# Altium footprint library texas.PCBLIB: 168 footprints (part 12 of 14)
Each footprint in its own frame and in the unit in brackets; x right, y up, seen from the top. Pads: shape width x height; smd on the part's side, far side on the other; paste and mask are expansions set on the pad; w line width, h text height; cw(c..) or ccw(c..) is an arc to the next point about the centre after c.
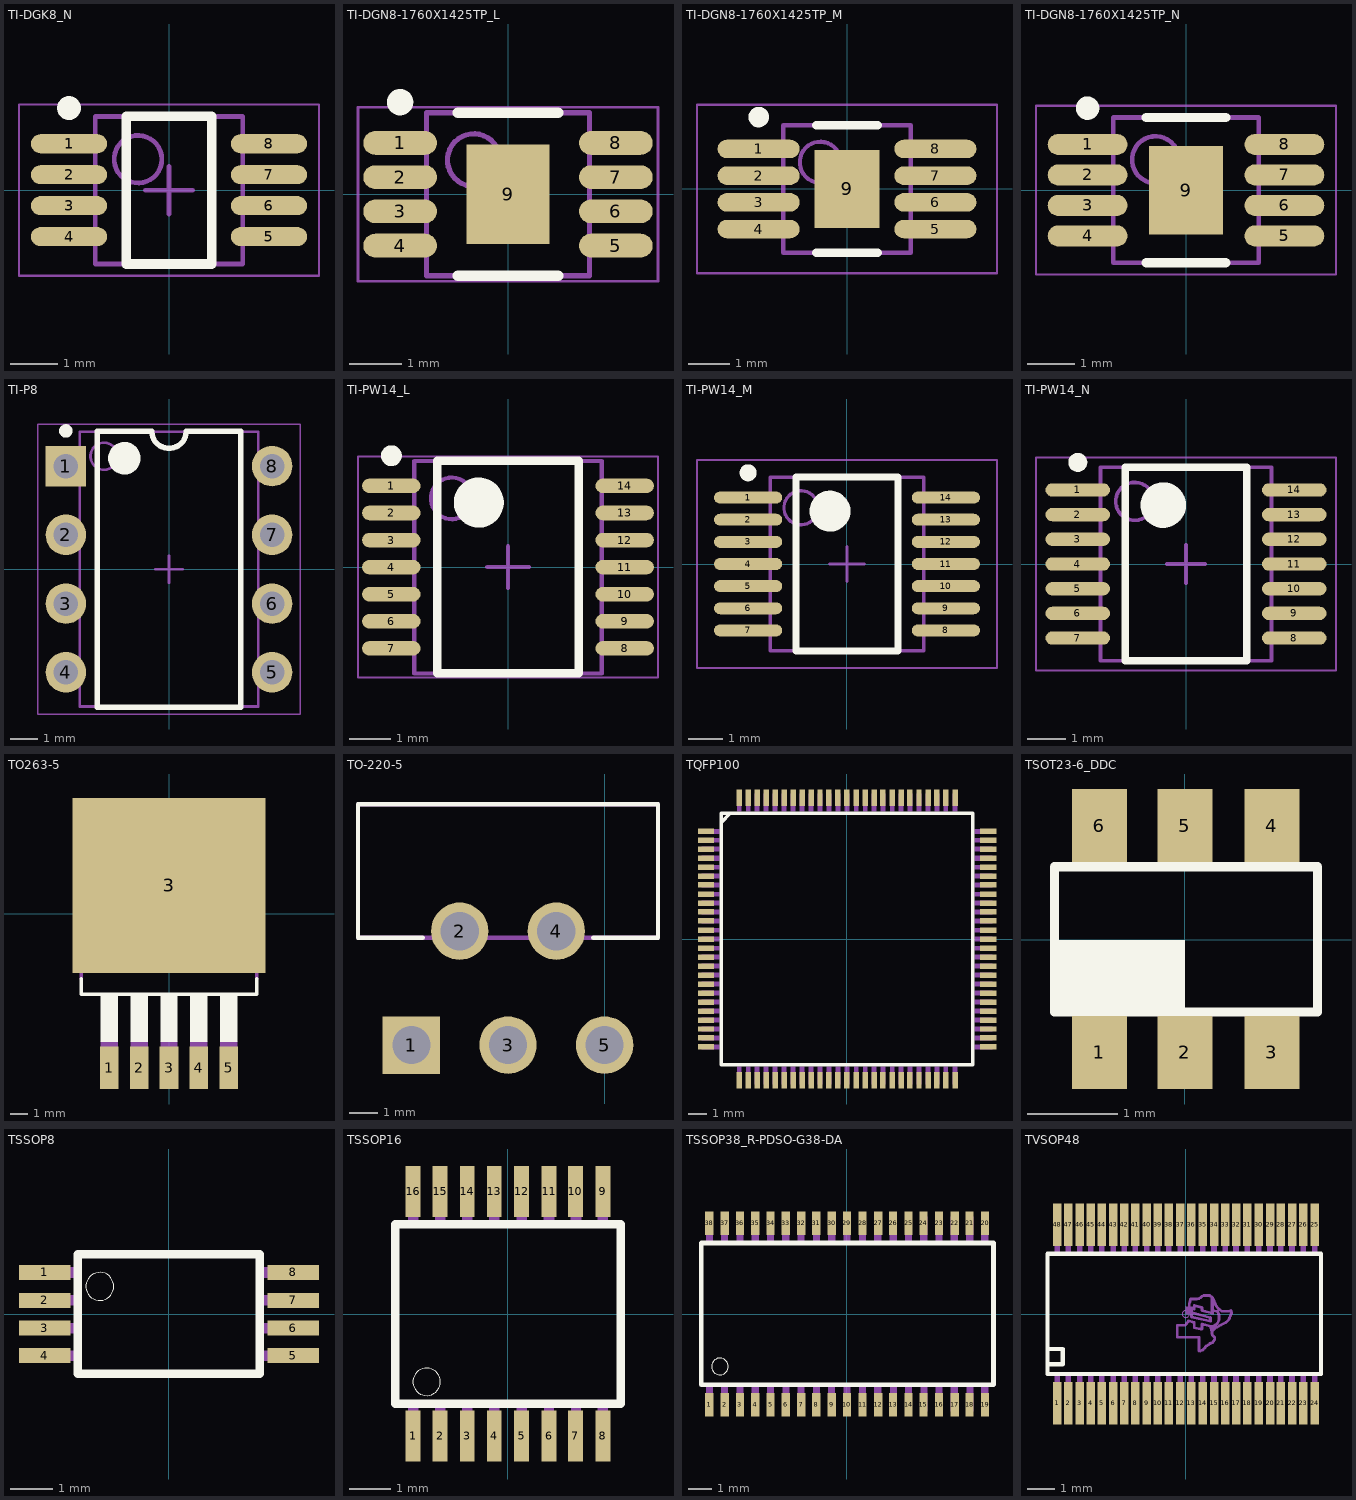
[diagram p11: the footprints below, top view; thin cyan lines are the x and y axes]

## TI-DGK8_N [mm] "SOP, 8-Leads, Body 3x3mm, Pitch 0.65mm, IPC Medium Density"
height 1.1
pads (8):
  oval 1.6x0.4 smd: 1(-2.1,0.975) 2(-2.1,0.325) 3(-2.1,-0.325) 4(-2.1,-0.975) 5(2.1,-0.975) 6(2.1,-0.325) 7(2.1,0.325) 8(2.1,0.975)
Top Overlay:
  circle w0.25: c-2.1,1.725 r0.125
  lines w0.2: -0.9,-1.55 -0.9,1.55 0.9,1.55 0.9,-1.55 -0.9,-1.55
Mechanical 13:
  circle w0.1: c-0.65,0.65 r0.5
  lines w0.1: -1.55,-1.55 -1.55,1.55 1.55,1.55 1.55,-1.55 -1.55,-1.55
Mechanical 15:
  lines w0.05: -3.15,-1.8 -3.15,1.8 3.15,1.8 3.15,-1.8 -3.15,-1.8
  lines w0.1: -0.5,0 0.5,0 ; 0,-0.5 0,0.5
3D body: height 1.1, standoff 0.05, extent -1.55,-1.55 1.55,1.55

## TI-DGN8-1760X1425TP_L [mm] "SOP, 8-Leads, Body 3x3mm, Pitch 0.65mm, Thermal Pad 1.76x1.425mm, IPC High Density"
height 1.1
pads (9):
  oval 1.4x0.45 smd: 1(-2.05,0.975) 2(-2.05,0.325) 3(-2.05,-0.325) 4(-2.05,-0.975) 5(2.05,-0.975) 6(2.05,-0.325) 7(2.05,0.325) 8(2.05,0.975)
  rect 1.57x1.89 smd: 9(0,0)
Top Overlay:
  circle w0.25: c-2.05,1.75 r0.125
  lines w0.2: -0.95,-1.55 0.95,-1.55 ; -0.95,1.55 0.95,1.55
Mechanical 13:
  circle w0.1: c-0.65,0.65 r0.5
  lines w0.1: -1.55,-1.55 1.55,-1.55 1.55,1.55 -1.55,1.55 -1.55,-1.55
Mechanical 15:
  lines w0.05: -2.85,-1.65 2.85,-1.65 2.85,1.65 -2.85,1.65 -2.85,-1.65
  lines w0.1: -0.5,0 0.5,0 ; 0,-0.5 0,0.5
3D body: height 1.1, standoff 0.05, extent -1.55,-1.55 1.55,1.55

## TI-DGN8-1760X1425TP_M [mm] "SOP, 8-Leads, Body 3x3mm, Pitch 0.65mm, Thermal Pad 1.76 x 1.425 mm, IPC Low Density"
height 1.1
pads (9):
  oval 2x0.45 smd: 1(-2.15,0.975) 2(-2.15,0.325) 3(-2.15,-0.325) 4(-2.15,-0.975) 5(2.15,-0.975) 6(2.15,-0.325) 7(2.15,0.325) 8(2.15,0.975)
  rect 1.57x1.89 smd: 9(0,0)
Top Overlay:
  circle w0.25: c-2.15,1.75 r0.125
  lines w0.2: -0.75,-1.55 0.75,-1.55 ; -0.75,1.55 0.75,1.55
Mechanical 13:
  circle w0.1: c-0.65,0.65 r0.5
  lines w0.1: -1.55,-1.55 1.55,-1.55 1.55,1.55 -1.55,1.55 -1.55,-1.55
Mechanical 15:
  lines w0.05: -3.65,-2.05 3.65,-2.05 3.65,2.05 -3.65,2.05 -3.65,-2.05
  lines w0.1: -0.5,0 0.5,0 ; 0,-0.5 0,0.5
3D body: height 1.1, standoff 0.05, extent -1.55,-1.55 1.55,1.55

## TI-DGN8-1760X1425TP_N [mm] "SOP, 8-Leads, Body 3x3mm, Pitch 0.65mm, Thermal Pad 1.76x1.425mm, IPC Medium Density"
height 1.1
pads (9):
  oval 1.7x0.45 smd: 1(-2.1,0.975) 2(-2.1,0.325) 3(-2.1,-0.325) 4(-2.1,-0.975) 5(2.1,-0.975) 6(2.1,-0.325) 7(2.1,0.325) 8(2.1,0.975)
  rect 1.57x1.89 smd: 9(0,0)
Top Overlay:
  circle w0.25: c-2.1,1.75 r0.125
  lines w0.2: -0.85,-1.55 0.85,-1.55 ; -0.85,1.55 0.85,1.55
Mechanical 13:
  circle w0.1: c-0.65,0.65 r0.5
  lines w0.1: -1.55,-1.55 -1.55,1.55 1.55,1.55 1.55,-1.55 -1.55,-1.55
Mechanical 15:
  lines w0.05: -3.2,-1.8 -3.2,1.8 3.2,1.8 3.2,-1.8 -3.2,-1.8
  lines w0.1: -0.5,0 0.5,0 ; 0,-0.5 0,0.5
3D body: height 1.1, standoff 0.05, extent -1.55,-1.55 1.55,1.55

## TI-P8 [mm] "DIP, 8-Leads, Body 9.59x6.35mm, Pitch 2.54mm"
height 5.08
pads (8):
  rect 1.5x1.5 hole 0.9: 1(-3.81,3.81)
  round 1.5 hole 0.9: 2(-3.81,1.27) 3(-3.81,-1.27) 4(-3.81,-3.81) 5(3.81,-3.81) 6(3.81,-1.27) 7(3.81,1.27) 8(3.81,3.81)
Top Overlay:
  circle w0.25: c-3.81,5.11 r0.125
  circle w0.6: c-1.65,4.1 r0.3
  lines w0.2: -2.65,-5.1 -2.65,5.1 -0.635,5.1 ccw(c0,5.1) 0.635,5.1 2.65,5.1 2.65,-5.1 -2.65,-5.1
Mechanical 13:
  circle w0.1: c-2.4,4.175 r0.5
  lines w0.1: -3.3,-5.075 -3.3,5.075 3.3,5.075 3.3,-5.075 -3.3,-5.075
Mechanical 15:
  lines w0.05: -4.85,-5.35 -4.85,5.35 4.85,5.35 4.85,-5.35 -4.85,-5.35
  lines w0.1: -0.5,0 0.5,0 ; 0,-0.5 0,0.5
3D body: height 2.66, standoff 0, extent -3.945,3.31 -3.675,4.31
3D body: height 2.93, standoff 2.66, extent -3.945,3.31 -3.3,4.31
3D body: height 0, standoff -1.6, extent -3.945,3.45 -3.675,4.17
3D body: height 2.66, standoff 0, extent -3.945,0.77 -3.675,1.77
3D body: height 2.93, standoff 2.66, extent -3.945,0.77 -3.3,1.77
3D body: height 0, standoff -1.6, extent -3.945,0.91 -3.675,1.63
3D body: height 2.66, standoff 0, extent -3.945,-1.77 -3.675,-0.77
3D body: height 2.93, standoff 2.66, extent -3.945,-1.77 -3.3,-0.77
3D body: height 0, standoff -1.6, extent -3.945,-1.63 -3.675,-0.91
3D body: height 2.66, standoff 0, extent -3.945,-4.31 -3.675,-3.31
3D body: height 2.93, standoff 2.66, extent -3.945,-4.31 -3.3,-3.31
3D body: height 0, standoff -1.6, extent -3.945,-4.17 -3.675,-3.45
3D body: height 2.66, standoff 0, extent 3.675,-4.31 3.945,-3.31
3D body: height 2.93, standoff 2.66, extent 3.3,-4.31 3.945,-3.31
3D body: height 0, standoff -1.6, extent 3.675,-4.17 3.945,-3.45
3D body: height 2.66, standoff 0, extent 3.675,-1.77 3.945,-0.77
3D body: height 2.93, standoff 2.66, extent 3.3,-1.77 3.945,-0.77
3D body: height 0, standoff -1.6, extent 3.675,-1.63 3.945,-0.91
3D body: height 2.66, standoff 0, extent 3.675,0.77 3.945,1.77
3D body: height 2.93, standoff 2.66, extent 3.3,0.77 3.945,1.77
3D body: height 0, standoff -1.6, extent 3.675,0.91 3.945,1.63
3D body: height 2.66, standoff 0, extent 3.675,3.31 3.945,4.31
3D body: height 2.93, standoff 2.66, extent 3.3,3.31 3.945,4.31
3D body: height 0, standoff -1.6, extent 3.675,3.45 3.945,4.17
3D body: height 5.08, standoff 0.51, extent -3.3,-5.075 3.3,5.075

## TI-PW14_L [mm] "SOP, 14-Leads, Body 5x4.4mm, Pitch 0.65mm, IPC High Density"
height 1.2
pads (14):
  oval 1.4x0.35 smd: 1(-2.8,1.95) 2(-2.8,1.3) 3(-2.8,0.65) 4(-2.8,0) 5(-2.8,-0.65) 6(-2.8,-1.3) 7(-2.8,-1.95) 8(2.8,-1.95) 9(2.8,-1.3) 10(2.8,-0.65) 11(2.8,0) 12(2.8,0.65) 13(2.8,1.3) 14(2.8,1.95)
Top Overlay:
  circle w0.25: c-2.8,2.675 r0.125
  circle w0.6: c-0.7,1.55 r0.3
  lines w0.2: -1.7,-2.55 -1.7,2.55 1.7,2.55 1.7,-2.55 -1.7,-2.55
Mechanical 13:
  circle w0.1: c-1.35,1.65 r0.5
  lines w0.1: -2.25,-2.55 -2.25,2.55 2.25,2.55 2.25,-2.55 -2.25,-2.55
Mechanical 15:
  lines w0.05: -3.6,-2.65 -3.6,2.65 3.6,2.65 3.6,-2.65 -3.6,-2.65
  lines w0.1: -0.5,0 0.5,0 ; 0,-0.5 0,0.5
3D body: height 1.2, standoff 0.05, extent -2.25,-2.55 2.25,2.55

## TI-PW14_M [mm] "SOP, 14-Leads, Body 5x4.4mm, Pitch 0.65mm, IPC Low Density"
height 1.2
pads (14):
  oval 2x0.35 smd: 1(-2.9,1.95) 2(-2.9,1.3) 3(-2.9,0.65) 4(-2.9,0) 5(-2.9,-0.65) 6(-2.9,-1.3) 7(-2.9,-1.95) 8(2.9,-1.95) 9(2.9,-1.3) 10(2.9,-0.65) 11(2.9,0) 12(2.9,0.65) 13(2.9,1.3) 14(2.9,1.95)
Top Overlay:
  circle w0.6: c-0.5,1.55 r0.3
  circle w0.25: c-2.9,2.675 r0.125
  lines w0.2: -1.5,-2.55 1.5,-2.55 1.5,2.55 -1.5,2.55 -1.5,-2.55
Mechanical 13:
  circle w0.1: c-1.35,1.65 r0.5
  lines w0.1: -2.25,-2.55 2.25,-2.55 2.25,2.55 -2.25,2.55 -2.25,-2.55
Mechanical 15:
  lines w0.05: -4.4,-3.05 4.4,-3.05 4.4,3.05 -4.4,3.05 -4.4,-3.05
  lines w0.1: -0.5,0 0.5,0 ; 0,-0.5 0,0.5
3D body: height 1.2, standoff 0.05, extent -2.25,-2.55 2.25,2.55

## TI-PW14_N [mm] "SOP, 14-Leads, Body 5x4.4mm, Pitch 0.65mm, IPC Medium Density"
height 1.2
pads (14):
  oval 1.7x0.35 smd: 1(-2.85,1.95) 2(-2.85,1.3) 3(-2.85,0.65) 4(-2.85,0) 5(-2.85,-0.65) 6(-2.85,-1.3) 7(-2.85,-1.95) 8(2.85,-1.95) 9(2.85,-1.3) 10(2.85,-0.65) 11(2.85,0) 12(2.85,0.65) 13(2.85,1.3) 14(2.85,1.95)
Top Overlay:
  circle w0.25: c-2.85,2.675 r0.125
  circle w0.6: c-0.6,1.55 r0.3
  lines w0.2: -1.6,-2.55 -1.6,2.55 1.6,2.55 1.6,-2.55 -1.6,-2.55
Mechanical 13:
  circle w0.1: c-1.35,1.65 r0.5
  lines w0.1: -2.25,-2.55 -2.25,2.55 2.25,2.55 2.25,-2.55 -2.25,-2.55
Mechanical 15:
  lines w0.05: -3.95,-2.8 -3.95,2.8 3.95,2.8 3.95,-2.8 -3.95,-2.8
  lines w0.1: -0.5,0 0.5,0 ; 0,-0.5 0,0.5
3D body: height 1.2, standoff 0.05, extent -2.25,-2.55 2.25,2.55

## TO263-5 [mil]
pads (6):
  rect 42x95 smd: 1(-134,-346.11) 2(-67,-346.11) 3(0,-346.11) 4(67,-346.11) 5(134,-346.11)
  rect 433.07x393.7 smd: 3(0,63.39)
Top Overlay:
  region: -153.25,-181.1 -115,-181.1 -115,-287.86 -153.25,-287.86
  region: -86.05,-181.1 -48,-181.1 -48,-287.56 -86.05,-287.56
  region: -19.03,-181.1 19,-181.1 19,-287.92 -19.03,-287.92
  region: 48.01,-181.1 86,-181.1 86,-287.48 48.01,-287.48
  region: 115.05,-181.1 153,-181.1 153,-287.52 115.05,-287.52
  lines w8: -196.85,-145.67 -196.85,-181.1 196.85,-181.1 196.85,-145.67
Mechanical 4:
  region: -153.05,-287.4 -115,-287.4 -115,-374.13 -153.05,-374.13
  region: -86.13,-287.4 -48,-287.4 -48,-374.57 -86.13,-374.57
  region: -19.01,-287.4 19,-287.4 19,-374.17 -19.01,-374.17
  region: 48.01,-287.4 86,-287.4 86,-374.09 48.01,-374.09
  region: 115.02,-287.4 153,-287.4 153,-374.08 115.02,-374.08
  region: -196.85,181.1 -196.85,206.69 -137.8,228.35 137.8,228.35 196.85,206.69 196.85,181.1
  region: -153.05,-287.4 -115,-287.4 -115,-374.13 -153.05,-374.13
  region: -86.13,-287.4 -48,-287.4 -48,-374.57 -86.13,-374.57
  region: -19.01,-287.4 19,-287.4 19,-374.17 -19.01,-374.17
  region: 48.01,-287.4 86,-287.4 86,-374.09 48.01,-374.09
  region: 115.02,-287.4 153,-287.4 153,-374.08 115.02,-374.08
  region: -196.85,181.1 -196.85,206.69 -137.8,228.35 137.8,228.35 196.85,206.69 196.85,181.1
  lines w8: -196.85,181.1 -196.85,-145.67 -196.85,181.1 ; -196.85,181.1 -196.85,206.69 ; -196.85,181.1 196.85,181.1 ; -196.85,181.1 -196.85,206.69 ; -196.85,181.1 196.85,181.1 ; -196.85,206.69 -137.8,228.35 ; -196.85,206.69 -137.8,228.35 ; -137.8,228.35 137.8,228.35 ; -137.8,228.35 137.8,228.35 ; 137.8,228.35 196.85,206.69 ; 137.8,228.35 196.85,206.69 ; 196.85,181.1 196.85,-145.67 196.85,181.1 ; 196.85,181.1 196.85,206.69 ; 196.85,181.1 196.85,206.69

## TO-220-5 [mil]
pads (5):
  rect 79.5x79.5 hole 53: 1(-268,-482)
  round 79.5 hole 53: 2(-201,-324) 3(-134,-482) 4(-67,-324) 5(0,-482)
Top Overlay:
  lines w6: -252,-333 -342,-333 -342,-148 74,-148 74,-333 -16,-333
Mechanical 4:
  lines w6: -342,-333 74,-333 ; -342,-333 -342,-148 ; -342,-333 74,-333 ; -342,-333 -342,-148 ; -342,-148 74,-148 ; -342,-148 74,-148 ; 74,-333 74,-148 ; 74,-333 74,-148

## TQFP100 [mil]
pads (100):
  rect 36x12 smd: 1(-309.06,237) 2(-309.06,217) 3(-309.06,197) 4(-309.06,178) 5(-309.06,158) 6(-309.06,138) 7(-309.06,119) 8(-309.06,99) 9(-309.06,79) 10(-309.06,60) 11(-309.06,40) 12(-309.06,20) 13(-309.06,0) 14(-309.06,-19.68) 15(-309.06,-39.37) 16(-309.06,-59.06) 17(-309.06,-78.74) 18(-309.06,-98.43) 19(-309.06,-118.11) 20(-309.06,-137.8) 21(-309.06,-157.48) 22(-309.06,-177.17) 23(-309.06,-196.85) 24(-309.06,-216.54) 25(-309.06,-236.22) 51(310,-236.22) 52(310,-216.54) 53(310,-196.85) 54(310,-177.17) 55(310,-157.48) 56(310,-137.8) 57(310,-118.11) 58(310,-98.43) 59(310,-78.74) 60(310,-59.06) 61(310,-39.37) 62(310,-19.68) 63(310,0) 64(310,20) 65(310,40) 66(310,60) 67(310,79) 68(310,99) 69(310,119) 70(310,138) 71(310,158) 72(310,178) 73(310,197) 74(310,217) 75(310,237)
  rect 12x36 smd: 26(-236.22,-309.06) 27(-216.54,-309.06) 28(-196.85,-309.06) 29(-177.17,-309.06) 30(-157.48,-309.06) 31(-137.8,-309.06) 32(-118.11,-309.06) 33(-98.43,-309.06) 34(-78.74,-309.06) 35(-59.06,-309.06) 36(-39.37,-309.06) 37(-19.68,-309.06) 38(0,-309.06) 39(20,-309.06) 40(40,-309.06) 41(60,-309.06) 42(79,-309.06) 43(99,-309.06) 44(119,-309.06) 45(138,-309.06) 46(158,-309.06) 47(178,-309.06) 48(197,-309.06) 49(217,-309.06) 50(237,-309.06) 76(237,310) 77(217,310) 78(197,310) 79(178,310) 80(158,310) 81(138,310) 82(119,310) 83(99,310) 84(79,310) 85(60,310) 86(40,310) 87(20,310) 88(0,310) 89(-19.68,310) 90(-39.37,310) 91(-59.06,310) 92(-78.74,310) 93(-98.43,310) 94(-118.11,310) 95(-137.8,310) 96(-157.48,310) 97(-177.17,310) 98(-196.85,310) 99(-216.54,310) 100(-236.22,310)
Top Overlay:
  lines w8: -275.53,256 -255.91,276 ; -275.53,-275.53 -275.53,276 276,276 276,-275.53 -275.53,-275.53
Top Paste:
  region: -240.72,324.25 -240.72,292.75 -231.72,292.75 -231.72,324.25
  region: -221.04,324.25 -221.04,292.75 -212.04,292.75 -212.04,324.25
  region: -201.35,324.25 -201.35,292.75 -192.35,292.75 -192.35,324.25
  region: -181.67,324.25 -181.67,292.75 -172.67,292.75 -172.67,324.25
  region: -161.98,324.25 -161.98,292.75 -152.98,292.75 -152.98,324.25
  region: -142.3,324.25 -142.3,292.75 -133.3,292.75 -133.3,324.25
  region: -122.61,324.25 -122.61,292.75 -113.61,292.75 -113.61,324.25
  region: -102.93,324.25 -102.93,292.75 -93.93,292.75 -93.93,324.25
  region: -83.24,324.25 -83.24,292.75 -74.24,292.75 -74.24,324.25
  region: -63.56,324.25 -63.56,292.75 -54.56,292.75 -54.56,324.25
  region: -43.87,324.25 -43.87,292.75 -34.87,292.75 -34.87,324.25
  region: -24.19,324.25 -24.19,292.75 -15.19,292.75 -15.19,324.25
  region: -4.37,324.37 -4.37,292.63 4.63,292.63 4.63,324.37
  region: 15.5,324.5 15.5,292.5 24.5,292.5 24.5,324.5
  region: 35.5,324.5 35.5,292.5 44.5,292.5 44.5,324.5
  region: 55,324 55,293 64,293 64,324
  region: 74.5,324.5 74.5,292.5 83.5,292.5 83.5,324.5
  region: 94.5,324.5 94.5,292.5 103.5,292.5 103.5,324.5
  region: 114,324 114,293 123,293 123,324
  region: 134,324 134,293 143,293 143,324
  region: 153.5,324.5 153.5,292.5 162.5,292.5 162.5,324.5
  region: 173,324 173,293 182,293 182,324
  region: 193,324 193,293 202,293 202,324
  region: 212.5,324.5 212.5,292.5 221.5,292.5 221.5,324.5
  region: 232,324 232,293 241,293 241,324
  region: 324,242 293,242 293,232 324,232
  region: 324,222 293,222 293,212 324,212
  region: 324,202 293,202 293,192 324,192
  region: 324,183 293,183 293,173 324,173
  region: 324,163 293,163 293,153 324,153
  region: 324,143 293,143 293,133 324,133
  region: 324,124 293,124 293,114 324,114
  region: 324,104 293,104 293,94 324,94
  region: 324,84 293,84 293,74 324,74
  region: 324,64 293,64 293,55 324,55
  region: 324,45 293,45 293,35 324,35
  region: 324,25 293,25 293,15 324,15
  region: 324,5 293,5 293,-4.92 324,-4.92
  region: 324,-14.76 293,-14.76 293,-24.61 324,-24.61
  region: 324,-34.45 293,-34.45 293,-44.29 324,-44.29
  region: 324,-54.13 293,-54.13 293,-63.98 324,-63.98
  region: 324,-73.82 293,-73.82 293,-83.66 324,-83.66
  region: 324,-93.5 293,-93.5 293,-103.35 324,-103.35
  region: 324,-113.19 293,-113.19 293,-123.03 324,-123.03
  region: 324,-132.87 293,-132.87 293,-142.72 324,-142.72
  region: 324,-152.56 293,-152.56 293,-162.4 324,-162.4
  region: 324,-172.24 293,-172.24 293,-182.09 324,-182.09
  region: 324,-191.93 293,-191.93 293,-201.77 324,-201.77
  region: 324,-211.61 293,-211.61 293,-221.46 324,-221.46
  region: 324,-231.3 293,-231.3 293,-241.14 324,-241.14
  region: 241.42,-323.57 241.42,-292.57 231.58,-292.57 231.58,-323.57
  region: 221.92,-324.07 221.92,-292.07 212.08,-292.07 212.08,-324.07
  region: 202.42,-323.57 202.42,-292.57 192.58,-292.57 192.58,-323.57
  region: 182.42,-323.57 182.42,-292.57 172.58,-292.57 172.58,-323.57
  region: 162.92,-324.07 162.92,-292.07 153.08,-292.07 153.08,-324.07
  region: 143.42,-323.57 143.42,-292.57 133.58,-292.57 133.58,-323.57
  region: 123.42,-323.57 123.42,-292.57 113.58,-292.57 113.58,-323.57
  region: 103.92,-324.07 103.92,-292.07 94.08,-292.07 94.08,-324.07
  region: 83.92,-324.07 83.92,-292.07 74.08,-292.07 74.08,-324.07
  region: 64.42,-323.57 64.42,-292.57 54.58,-292.57 54.58,-323.57
  region: 44.92,-324.07 44.92,-292.07 35.08,-292.07 35.08,-324.07
  region: 24.92,-324.07 24.92,-292.07 15.08,-292.07 15.08,-324.07
  region: 5.05,-323.94 5.05,-292.2 -4.8,-292.2 -4.8,-323.94
  region: -14.76,-323.82 -14.76,-292.32 -24.61,-292.32 -24.61,-323.82
  region: -34.45,-323.82 -34.45,-292.32 -44.29,-292.32 -44.29,-323.82
  region: -54.13,-323.82 -54.13,-292.32 -63.98,-292.32 -63.98,-323.82
  region: -73.82,-323.82 -73.82,-292.32 -83.66,-292.32 -83.66,-323.82
  region: -93.5,-323.82 -93.5,-292.32 -103.35,-292.32 -103.35,-323.82
  region: -113.19,-323.82 -113.19,-292.32 -123.03,-292.32 -123.03,-323.82
  region: -132.87,-323.82 -132.87,-292.32 -142.72,-292.32 -142.72,-323.82
  region: -152.56,-323.82 -152.56,-292.32 -162.4,-292.32 -162.4,-323.82
  region: -172.24,-323.82 -172.24,-292.32 -182.09,-292.32 -182.09,-323.82
  region: -191.93,-323.82 -191.93,-292.32 -201.77,-292.32 -201.77,-323.82
  region: -211.61,-323.82 -211.61,-292.32 -221.46,-292.32 -221.46,-323.82
  region: -231.3,-323.82 -231.3,-292.32 -241.14,-292.32 -241.14,-323.82
  rectangle: -323.82,-241.14 -292.32,-231.3
  rectangle: -323.82,-221.46 -292.32,-211.61
  rectangle: -323.82,-201.77 -292.32,-191.93
  rectangle: -323.82,-182.09 -292.32,-172.24
  rectangle: -323.82,-162.4 -292.32,-152.56
  rectangle: -323.82,-142.72 -292.32,-132.87
  rectangle: -323.82,-123.03 -292.32,-113.19
  rectangle: -323.82,-103.35 -292.32,-93.5
  rectangle: -323.82,-83.66 -292.32,-73.82
  rectangle: -323.82,-63.98 -292.32,-54.13
  rectangle: -323.82,-44.29 -292.32,-34.45
  rectangle: -323.82,-24.61 -292.32,-14.76
  rectangle: -323.82,-4.92 -292.32,5
  rectangle: -323.82,15 -292.32,25
  rectangle: -323.82,35 -292.32,45
  rectangle: -323.82,55 -292.32,64
  rectangle: -323.82,74 -292.32,84
  rectangle: -323.82,94 -292.32,104
  rectangle: -323.82,114 -292.32,124
  rectangle: -323.82,133 -292.32,143
  rectangle: -323.82,153 -292.32,163
  rectangle: -323.82,173 -292.32,183
  rectangle: -323.82,192 -292.32,202
  rectangle: -323.82,212 -292.32,222
  rectangle: -323.82,232 -292.32,242
Top Solder:
  region: -242.72,329.17 -242.72,287.83 -229.72,287.83 -229.72,329.17
  region: -223.04,329.17 -223.04,287.83 -210.04,287.83 -210.04,329.17
  region: -203.35,329.17 -203.35,287.83 -190.35,287.83 -190.35,329.17
  region: -183.67,329.17 -183.67,287.83 -170.67,287.83 -170.67,329.17
  region: -163.98,329.17 -163.98,287.83 -150.98,287.83 -150.98,329.17
  region: -144.3,329.17 -144.3,287.83 -131.3,287.83 -131.3,329.17
  region: -124.61,329.17 -124.61,287.83 -111.61,287.83 -111.61,329.17
  region: -104.93,329.17 -104.93,287.83 -91.93,287.83 -91.93,329.17
  region: -85.24,329.17 -85.24,287.83 -72.24,287.83 -72.24,329.17
  region: -65.56,329.17 -65.56,287.83 -52.56,287.83 -52.56,329.17
  region: -45.87,329.17 -45.87,287.83 -32.87,287.83 -32.87,329.17
  region: -26.18,329.18 -26.18,287.82 -13.18,287.82 -13.18,329.18
  region: -6.33,329.33 -6.33,287.67 6.67,287.67 6.67,329.33
  region: 13.51,329.49 13.51,287.51 26.51,287.51 26.51,329.49
  region: 33.5,329.5 33.5,287.5 46.5,287.5 46.5,329.5
  region: 53,329 53,288 66,288 66,329
  region: 73,329 73,288 86,288 86,329
  region: 92.5,329.5 92.5,287.5 105.5,287.5 105.5,329.5
  region: 112,329 112,288 125,288 125,329
  region: 132,329 132,288 145,288 145,329
  region: 151.5,329.5 151.5,287.5 164.5,287.5 164.5,329.5
  region: 171,329 171,288 184,288 184,329
  region: 191,329 191,288 204,288 204,329
  region: 210.5,329.5 210.5,287.5 223.5,287.5 223.5,329.5
  region: 230,329 230,288 243,288 243,329
  region: 329,244 288,244 288,230 329,230
  region: 329,224 288,224 288,210 329,210
  region: 329,204 288,204 288,190 329,190
  region: 329,185 288,185 288,171 329,171
  region: 329,165 288,165 288,151 329,151
  region: 329,145 288,145 288,131 329,131
  region: 329,125 288,125 288,112 329,112
  region: 329,106 288,106 288,92 329,92
  region: 329,86 288,86 288,72 329,72
  region: 329,66 288,66 288,53 329,53
  region: 329,47 288,47 288,33 329,33
  region: 329,27 288,27 288,13 329,13
  region: 329,7 288,7 288,-6.89 329,-6.89
  region: 329,-12.8 288,-12.8 288,-26.57 329,-26.57
  region: 329,-32.48 288,-32.48 288,-46.26 329,-46.26
  region: 329,-52.17 288,-52.17 288,-65.94 329,-65.94
  region: 329,-71.85 288,-71.85 288,-85.63 329,-85.63
  region: 329,-91.54 288,-91.54 288,-105.31 329,-105.31
  region: 329,-111.22 288,-111.22 288,-125 329,-125
  region: 329,-130.91 288,-130.91 288,-144.69 329,-144.69
  region: 329,-150.59 288,-150.59 288,-164.37 329,-164.37
  region: 329,-170.28 288,-170.28 288,-184.06 329,-184.06
  region: 329,-189.96 288,-189.96 288,-203.74 329,-203.74
  region: 329,-209.65 288,-209.65 288,-223.43 329,-223.43
  region: 329,-229.33 288,-229.33 288,-243.11 329,-243.11
  region: 243.39,-328.57 243.39,-287.57 229.61,-287.57 229.61,-328.57
  region: 223.89,-329.07 223.89,-287.07 210.11,-287.07 210.11,-329.07
  region: 204.39,-328.57 204.39,-287.57 190.61,-287.57 190.61,-328.57
  region: 184.39,-328.57 184.39,-287.57 170.61,-287.57 170.61,-328.57
  region: 164.89,-329.07 164.89,-287.07 151.11,-287.07 151.11,-329.07
  region: 145.39,-328.57 145.39,-287.57 131.61,-287.57 131.61,-328.57
  region: 125.39,-328.57 125.39,-287.57 111.61,-287.57 111.61,-328.57
  region: 105.89,-329.07 105.89,-287.07 92.11,-287.07 92.11,-329.07
  region: 86.39,-328.57 86.39,-287.57 72.61,-287.57 72.61,-328.57
  region: 66.39,-328.57 66.39,-287.57 52.61,-287.57 52.61,-328.57
  region: 46.89,-329.07 46.89,-287.07 33.11,-287.07 33.11,-329.07
  region: 26.9,-329.06 26.9,-287.08 13.12,-287.08 13.12,-329.06
  region: 7.06,-328.91 7.06,-287.24 -6.72,-287.24 -6.72,-328.91
  region: -12.79,-328.75 -12.79,-287.39 -26.57,-287.39 -26.57,-328.75
  region: -32.48,-328.74 -32.48,-287.4 -46.26,-287.4 -46.26,-328.74
  region: -52.17,-328.74 -52.17,-287.4 -65.94,-287.4 -65.94,-328.74
  region: -71.85,-328.74 -71.85,-287.4 -85.63,-287.4 -85.63,-328.74
  region: -91.54,-328.74 -91.54,-287.4 -105.31,-287.4 -105.31,-328.74
  region: -111.22,-328.74 -111.22,-287.4 -125,-287.4 -125,-328.74
  region: -130.91,-328.74 -130.91,-287.4 -144.69,-287.4 -144.69,-328.74
  region: -150.59,-328.74 -150.59,-287.4 -164.37,-287.4 -164.37,-328.74
  region: -170.28,-328.74 -170.28,-287.4 -184.06,-287.4 -184.06,-328.74
  region: -189.96,-328.74 -189.96,-287.4 -203.74,-287.4 -203.74,-328.74
  region: -209.65,-328.74 -209.65,-287.4 -223.43,-287.4 -223.43,-328.74
  region: -229.33,-328.74 -229.33,-287.4 -243.11,-287.4 -243.11,-328.74
  rectangle: -328.74,-243.11 -287.4,-229.33
  rectangle: -328.74,-223.43 -287.4,-209.65
  rectangle: -328.74,-203.74 -287.4,-189.96
  rectangle: -328.74,-184.06 -287.4,-170.28
  rectangle: -328.74,-164.37 -287.4,-150.59
  rectangle: -328.74,-144.69 -287.4,-130.91
  rectangle: -328.74,-125 -287.4,-111.22
  rectangle: -328.74,-105.31 -287.4,-91.54
  rectangle: -328.74,-85.63 -287.4,-71.85
  rectangle: -328.74,-65.94 -287.4,-52.17
  rectangle: -328.74,-46.26 -287.4,-32.48
  rectangle: -328.74,-26.57 -287.4,-12.8
  rectangle: -328.74,-6.89 -287.4,7
  rectangle: -328.74,13 -287.4,27
  rectangle: -328.74,33 -287.4,47
  rectangle: -328.74,53 -287.4,66
  rectangle: -328.74,72 -287.4,86
  rectangle: -328.74,92 -287.4,106
  rectangle: -328.74,112 -287.4,125
  rectangle: -328.74,131 -287.4,145
  rectangle: -328.74,151 -287.4,165
  rectangle: -328.74,171 -287.4,185
  rectangle: -328.74,190 -287.4,204
  rectangle: -328.74,210 -287.4,224
  rectangle: -328.74,230 -287.4,244
Mechanical 4:
  rectangle: -318.9,153 -279.53,163
  rectangle: -318.9,172 -279.53,183
  rectangle: -318.9,192 -279.53,203
  rectangle: -318.9,212 -279.53,222
  rectangle: -241.54,280 -230.91,319
  rectangle: -221.85,280 -211.22,319
  rectangle: -202.17,280 -191.54,319
  rectangle: -182.48,280 -171.85,319
  rectangle: -162.8,280 -152.17,319
  rectangle: -143.11,280 -132.48,319
  rectangle: -123.43,280 -112.8,319
  rectangle: -103.74,280 -93.11,319
  rectangle: -84.06,280 -73.43,319
  rectangle: -64.37,280 -53.74,319
  rectangle: -44.69,280 -34.06,319
  rectangle: -25,280 -14.37,319
  rectangle: -5.32,280 6,319
  rectangle: 15,280 25,319
  rectangle: 35,280 45,319
  rectangle: 54,280 65,319
  rectangle: 74,280 85,319
  rectangle: 94,280 104,319
  rectangle: 113,280 124,319
  rectangle: 133,280 144,319
  rectangle: 153,280 163,319
  rectangle: 172,280 183,319
  rectangle: 192,280 203,319
  rectangle: 212,280 222,319
  rectangle: 231,280 242,319
  rectangle: 280,231 319,242
  rectangle: 280,212 319,222
  rectangle: 280,192 319,203
  rectangle: 280,172 319,183
  rectangle: 280,153 319,163
  rectangle: 280,133 319,144
  rectangle: 280,113 319,124
  rectangle: 280,94 319,104
  rectangle: 280,74 319,85
  rectangle: 280,54 319,65
  rectangle: 280,35 319,45
  rectangle: 280,15 319,25
  rectangle: 280,-5.32 319,6
  rectangle: 280,-25 319,-14.37
  rectangle: 280,-44.69 319,-34.06
  rectangle: 280,-64.37 319,-53.74
  rectangle: 280,-84.06 319,-73.43
  rectangle: 280,-103.74 319,-93.11
  rectangle: 280,-123.43 319,-112.8
  rectangle: 280,-143.11 319,-132.48
  rectangle: 280,-162.8 319,-152.17
  rectangle: 280,-182.48 319,-171.85
  rectangle: 280,-202.17 319,-191.54
  rectangle: 280,-221.85 319,-211.22
  rectangle: 280,-241.54 319,-230.91
  rectangle: 231,-318.9 242,-279.53
  rectangle: 212,-318.9 222,-279.53
  rectangle: 192,-318.9 203,-279.53
  rectangle: 172,-318.9 183,-279.53
  rectangle: 153,-318.9 163,-279.53
  rectangle: 133,-318.9 144,-279.53
  rectangle: 113,-318.9 124,-279.53
  rectangle: 94,-318.9 104,-279.53
  rectangle: 74,-318.9 85,-279.53
  rectangle: 54,-318.9 65,-279.53
  rectangle: 35,-318.9 45,-279.53
  rectangle: 15,-318.9 25,-279.53
  rectangle: -5.32,-318.9 6,-279.53
  rectangle: -25,-318.9 -14.37,-279.53
  rectangle: -44.69,-318.9 -34.06,-279.53
  rectangle: -64.37,-318.9 -53.74,-279.53
  rectangle: -84.06,-318.9 -73.43,-279.53
  rectangle: -103.74,-318.9 -93.11,-279.53
  rectangle: -123.43,-318.9 -112.8,-279.53
  rectangle: -143.11,-318.9 -132.48,-279.53
  rectangle: -162.8,-318.9 -152.17,-279.53
  rectangle: -182.48,-318.9 -171.85,-279.53
  rectangle: -202.17,-318.9 -191.54,-279.53
  rectangle: -221.85,-318.9 -211.22,-279.53
  rectangle: -241.54,-318.9 -230.91,-279.53
  rectangle: -318.9,-241.54 -279.53,-230.91
  rectangle: -318.9,-221.85 -279.53,-211.22
  rectangle: -318.9,-202.17 -279.53,-191.54
  rectangle: -318.9,-182.48 -279.53,-171.85
  rectangle: -318.9,-162.8 -279.53,-152.17
  rectangle: -318.9,-143.11 -279.53,-132.48
  rectangle: -318.9,-123.43 -279.53,-112.8
  rectangle: -318.9,-103.74 -279.53,-93.11
  rectangle: -318.9,-84.06 -279.53,-73.43
  rectangle: -318.9,-64.37 -279.53,-53.74
  rectangle: -318.9,-44.69 -279.53,-34.06
  rectangle: -318.9,-25 -279.53,-14.37
  rectangle: -318.9,-5.32 -279.53,6
  rectangle: -318.9,15 -279.53,25
  rectangle: -318.9,35 -279.53,45
  rectangle: -318.9,54 -279.53,65
  rectangle: -318.9,74 -279.53,85
  rectangle: -318.9,94 -279.53,104
  rectangle: -318.9,113 -279.53,124
  rectangle: -318.9,133 -279.53,144
  rectangle: -318.9,153 -279.53,163
  rectangle: -318.9,172 -279.53,183
  rectangle: -318.9,192 -279.53,203
  rectangle: -318.9,212 -279.53,222
  rectangle: -318.9,231 -279.53,242

## TSOT23-6_DDC [mil]
pads (6):
  rect 24x32 smd: 1(-37.4,-49.21) 2(0,-49.21) 3(38,-49.21) 4(38,50) 5(0,50) 6(-37.4,50)
Top Overlay:
  rectangle: -56.1,-29.53 0,0
  lines w4: -57.09,-31.5 -57.09,32 58,32 58,-31.5 -57.09,-31.5
Mechanical 4:
  rectangle: -47.24,33 -27.56,60
  rectangle: -9.84,33 10,60
  rectangle: 28,33 48,60
  region: 48,-32.48 28,-32.48 28,-59.06 48,-59.06
  region: 10,-32.48 -9.84,-32.48 -9.84,-59.06 10,-59.06
  region: -27.56,-32.48 -47.24,-32.48 -47.24,-59.06 -27.56,-59.06

## TSSOP8 [mil]
pads (8):
  rect 48x14 smd: 1(-115.16,39) 2(-115.16,13) 3(-115.16,-12.8) 4(-115.16,-38.39) 5(116,-38.39) 6(116,-12.8) 7(116,13) 8(116,39)
Top Overlay:
  circle w0: c-63.98,26 r13
  lines w8: -84.65,-55.12 85,-55.12 85,56 -84.65,56 -84.65,-55.12
Mechanical 4:
  rectangle: -125.98,34 -86.61,44
  rectangle: -125.98,8 -86.61,18
  rectangle: -125.98,-17.72 -86.61,-7.87
  rectangle: -125.98,-43.31 -86.61,-33.46
  rectangle: 87,-43.31 126,-33.46
  rectangle: 87,-17.72 126,-7.87
  rectangle: 87,8 126,18
  rectangle: 87,34 126,44

## TSSOP16 [mil]
pads (16):
  rect 14x48 smd: 1(-89.57,-115.16) 2(-63.98,-115.16) 3(-38.39,-115.16) 4(-12.8,-115.16) 5(13,-115.16) 6(39,-115.16) 7(64,-115.16) 8(90,-115.16) 9(90,116) 10(64,116) 11(39,116) 12(13,116) 13(-12.8,116) 14(-38.39,116) 15(-63.98,116) 16(-89.57,116)
Top Overlay:
  circle w0: c-76.77,-63.98 r13
  lines w8: -106.3,-84.65 -106.3,85 107,85 107,-84.65 -106.3,-84.65
Top Solder:
  rectangle: -98.43,-141.73 -80.71,-88.58
  rectangle: -72.83,-141.73 -55.12,-88.58
  rectangle: -47.24,-141.73 -29.53,-88.58
  rectangle: -21.65,-141.73 -3.94,-88.58
  rectangle: 4,-141.73 22,-88.58
  rectangle: 30,-141.73 48,-88.58
  rectangle: 56,-141.73 73,-88.58
  rectangle: 81,-141.73 99,-88.58
  region: 99,142 81,142 81,89 99,89
  region: 73,142 56,142 56,89 73,89
  region: 48,142 30,142 30,89 48,89
  region: 22,142 4,142 4,89 22,89
  region: -3.94,142 -21.65,142 -21.65,89 -3.94,89
  region: -29.53,142 -47.24,142 -47.24,89 -29.53,89
  region: -55.12,142 -72.83,142 -72.83,89 -55.12,89
  region: -80.71,142 -98.43,142 -98.43,89 -80.71,89
Mechanical 4:
  region: -84.65,-129.92 -84.65,-86.61 -94.49,-86.61 -94.49,-129.92
  region: -59.06,-129.92 -59.06,-86.61 -68.9,-86.61 -68.9,-129.92
  region: -33.46,-129.92 -33.46,-86.61 -43.31,-86.61 -43.31,-129.92
  region: -7.8,-129.99 -7.8,-86.54 -17.65,-86.54 -17.65,-129.99
  region: 8.15,-86.34 8.15,-130.2 17.99,-130.2 17.99,-86.34
  region: 34.08,-86.27 34.08,-130.27 43.92,-130.27 43.92,-86.27
  region: 59.58,-86.77 59.58,-129.77 69.42,-129.77 69.42,-86.77
  region: 85.08,-86.27 85.08,-130.27 94.92,-130.27 94.92,-86.27
  region: 85,131 85,87 95,87 95,131
  region: 59.5,130.5 59.5,87.5 69.5,87.5 69.5,130.5
  region: 34,131 34,87 44,87 44,131
  region: 8.07,130.93 8.07,87.07 18.07,87.07 18.07,130.93
  region: -7.72,87.28 -7.72,130.72 -17.72,130.72 -17.72,87.28
  region: -33.39,87.35 -33.39,130.65 -43.39,130.65 -43.39,87.35
  region: -58.98,87.35 -58.98,130.65 -68.98,130.65 -68.98,87.35
  region: -84.57,87.35 -84.57,130.65 -94.57,130.65 -94.57,87.35

## TSSOP38_R-PDSO-G38-DA [mil]
pads (38):
  rect 14x40 smd: 1(-230.31,-151.57) 2(-204.72,-151.57) 3(-179.13,-151.57) 4(-153.54,-151.57) 5(-127.95,-151.57) 6(-102.36,-151.57) 7(-76.77,-151.57) 8(-51.18,-151.57) 9(-25.59,-151.57) 10(0,-151.57) 11(26,-151.57) 12(52,-151.57) 13(77,-151.57) 14(103,-151.57) 15(128,-151.57) 16(154,-151.57) 17(180,-151.57) 18(205,-151.57) 19(231,-151.57) 20(231,152) 21(205,152) 22(180,152) 23(154,152) 24(128,152) 25(103,152) 26(77,152) 27(52,152) 28(26,152) 29(0,152) 30(-25.59,152) 31(-51.18,152) 32(-76.77,152) 33(-102.36,152) 34(-127.95,152) 35(-153.54,152) 36(-179.13,152) 37(-204.72,152) 38(-230.31,152)
Top Overlay:
  circle w0: c-212.6,-87.6 r14
  lines w8: -244.03,-118.05 245,-118.05 245,119 -244.03,119 -244.03,-118.05
Mechanical 4:
  region: -224.31,122.33 -224.31,163.67 -236.31,163.67 -236.31,122.33
  region: -198.72,122.33 -198.72,163.67 -210.72,163.67 -210.72,122.33
  region: -173.13,122.33 -173.13,163.67 -185.13,163.67 -185.13,122.33
  region: -147.54,122.33 -147.54,163.67 -159.54,163.67 -159.54,122.33
  region: -121.95,122.33 -121.95,163.67 -133.95,163.67 -133.95,122.33
  region: -96.36,122.33 -96.36,163.67 -108.36,163.67 -108.36,122.33
  region: -70.77,122.33 -70.77,163.67 -82.77,163.67 -82.77,122.33
  region: -45.18,122.33 -45.18,163.67 -57.18,163.67 -57.18,122.33
  region: -19.59,122.33 -19.59,163.67 -31.59,163.67 -31.59,122.33
  region: 6.17,122.17 6.17,163.83 -5.83,163.83 -5.83,122.17
  region: 32,122 32,164 20,164 20,122
  region: 57.5,122.5 57.5,163.5 45.5,163.5 45.5,122.5
  region: 83.5,122.5 83.5,163.5 71.5,163.5 71.5,122.5
  region: 109,122 109,164 97,164 97,122
  region: 134.5,122.5 134.5,163.5 122.5,163.5 122.5,122.5
  region: 160,122 160,164 148,164 148,122
  region: 185.5,122.5 185.5,163.5 173.5,163.5 173.5,122.5
  region: 211.5,122.5 211.5,163.5 199.5,163.5 199.5,122.5
  region: 236.5,122.5 236.5,163.5 224.5,163.5 224.5,122.5
  region: 236.41,-163.22 236.41,-122.22 224.59,-122.22 224.59,-163.22
  region: 211.41,-163.22 211.41,-122.22 199.59,-122.22 199.59,-163.22
  region: 185.41,-163.22 185.41,-122.22 173.59,-122.22 173.59,-163.22
  region: 159.91,-163.72 159.91,-121.72 148.09,-121.72 148.09,-163.72
  region: 134.41,-163.22 134.41,-122.22 122.59,-122.22 122.59,-163.22
  region: 108.91,-163.72 108.91,-121.72 97.09,-121.72 97.09,-163.72
  region: 83.41,-163.22 83.41,-122.22 71.59,-122.22 71.59,-163.22
  region: 57.41,-163.22 57.41,-122.22 45.59,-122.22 45.59,-163.22
  region: 31.91,-163.72 31.91,-121.72 20.09,-121.72 20.09,-163.72
  region: 6.07,-163.55 6.07,-121.88 -5.74,-121.88 -5.74,-163.55
  region: -19.69,-163.39 -19.69,-122.05 -31.5,-122.05 -31.5,-163.39
  region: -45.28,-163.39 -45.28,-122.05 -57.09,-122.05 -57.09,-163.39
  region: -70.87,-163.39 -70.87,-122.05 -82.68,-122.05 -82.68,-163.39
  region: -96.46,-163.39 -96.46,-122.05 -108.27,-122.05 -108.27,-163.39
  region: -122.05,-163.39 -122.05,-122.05 -133.86,-122.05 -133.86,-163.39
  region: -147.64,-163.39 -147.64,-122.05 -159.45,-122.05 -159.45,-163.39
  region: -173.23,-163.39 -173.23,-122.05 -185.04,-122.05 -185.04,-163.39
  region: -198.82,-163.39 -198.82,-122.05 -210.63,-122.05 -210.63,-163.39
  region: -224.41,-163.39 -224.41,-122.05 -236.22,-122.05 -236.22,-163.39

## TVSOP48 [mil]
pads (48):
  rect 12x60 smd: 1(-181.1,-125.98) 2(-165.35,-125.98) 3(-149.61,-125.98) 4(-133.86,-125.98) 5(-118.11,-125.98) 6(-102.36,-125.98) 7(-86.61,-125.98) 8(-70.87,-125.98) 9(-55.12,-125.98) 10(-39.37,-125.98) 11(-23.62,-125.98) 12(-7.87,-125.98) 13(8,-125.98) 14(24,-125.98) 15(40,-125.98) 16(56,-125.98) 17(71,-125.98) 18(87,-125.98) 19(103,-125.98) 20(119,-125.98) 21(134,-125.98) 22(150,-125.98) 23(166,-125.98) 24(182,-125.98) 25(182,126) 26(166,126) 27(150,126) 28(134,126) 29(119,126) 30(103,126) 31(87,126) 32(71,126) 33(56,126) 34(40,126) 35(24,126) 36(8,126) 37(-7.87,126) 38(-23.62,126) 39(-39.37,126) 40(-55.12,126) 41(-70.87,126) 42(-86.61,126) 43(-102.36,126) 44(-118.11,126) 45(-133.86,126) 46(-149.61,126) 47(-165.35,126) 48(-181.1,126)
Top Overlay:
  lines w6: -192.91,-49.21 -173.23,-49.21 -173.23,-70.87 -194.88,-70.87 ; -194.88,-70.87 -194.88,85 191,85 191,-84.65 -194.88,-84.65 -194.88,-70.87
Mechanical 4:
  drawing of 146 lines, arcs and shapes, not listed